# Altium footprint library Capacitors.PcbLib: 90 footprints (part 5 of 6)
Each footprint in its own frame and in the unit in brackets; x right, y up, seen from the top. Pads: shape width x height; smd on the part's side, far side on the other; paste and mask are expansions set on the pad; w line width, h text height; cw(c..) or ccw(c..) is an arc to the next point about the centre after c.
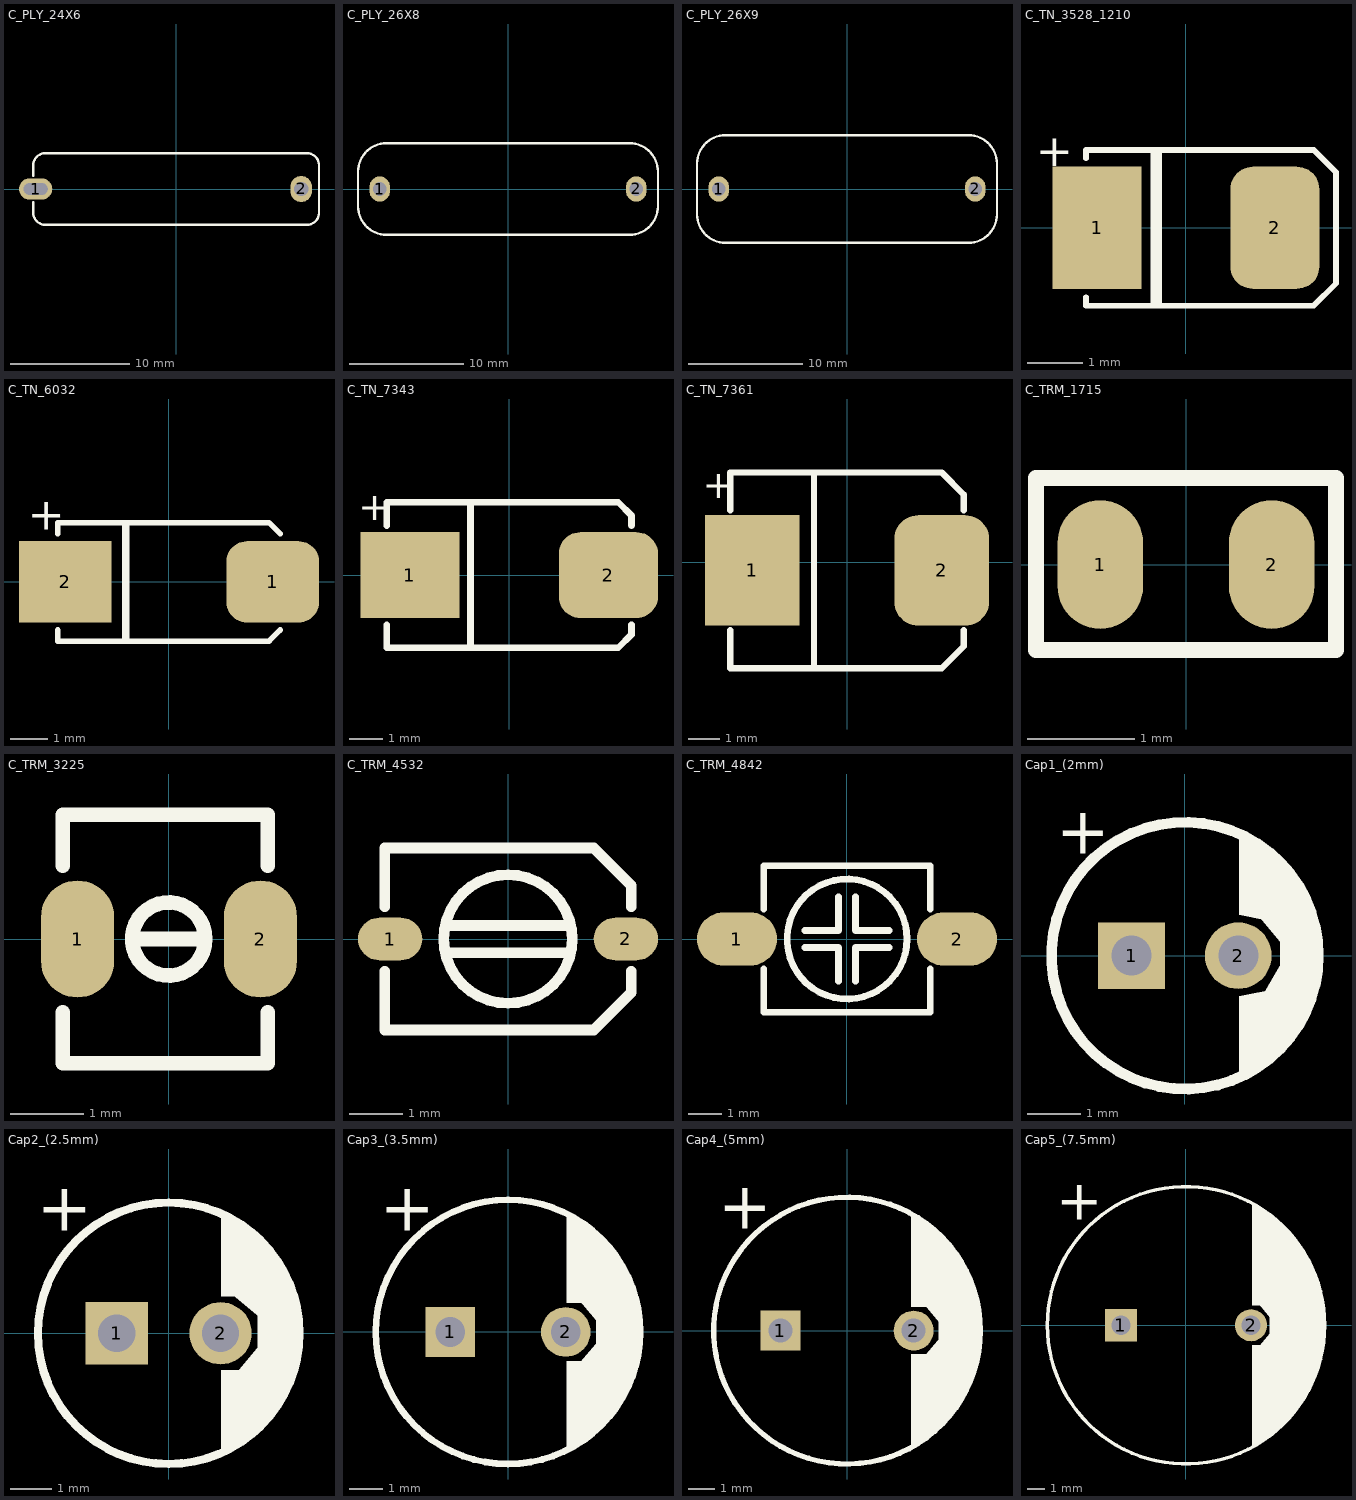
[diagram p4: the footprints below, top view; thin cyan lines are the x and y axes]

## C_PLY_24X6 [mm] "CAP, POLYESTER, 23.8X5.8mm pitch: 20.0mm, 0.33uF 400V"
pads (2):
  oval 2.8x1.8 hole 1 slot 2 at 0 deg: 1(-11.8,0)
  oval 1.8x2.2 hole 1.2: 2(10.5,0)
Top Overlay:
  lines w0.2: -12,-2.1 -12,-1.1 ; -12,-2 ccw(c-11,-2) -11,-3 11,-3 ccw(c11,-2) 12,-2 12,2.1 ; -12,1.1 -12,2.1 ; -12,2 cw(c-11,2) -11,3 11,3 cw(c11,2) 12,2
3D body "Cap 330n - 400V Poly_2009.STEP": height 10.92, standoff -3, extent -11.888,-2.85 11.862,2.901

## C_PLY_26X8 [mm] "CAP, POLYESTER, 26.0X7.8mm pitch: 20.0mm, 0.68uF 400V"
pads (2):
  oval 1.8x2.2 hole 1.2: 1(-11.2,0) 2(11.2,0)
Top Overlay:
  lines w0.2: -13.1,-1.5 ccw(c-10.6,-1.5) -10.6,-4 10.6,-4 ccw(c10.6,-1.5) 13.1,-1.5 13.1,1.5 ccw(c10.6,1.5) 10.6,4 -10.6,4 ccw(c-10.6,1.5) -13.1,1.5 -13.1,-1.5
3D body "User Library-ECQE(F) 0_33uf 630Vdc 250Vac.step": height 19, standoff -3, extent -13,-3.9 13,3.9

## C_PLY_26X9 [mm] "CAP, POLYESTER, 26.0X9.3mm pitch: 20.0mm, 0.68uF 400V"
pads (2):
  oval 1.8x2.2 hole 1.2: 1(-11.2,0) 2(11.2,0)
Top Overlay:
  lines w0.2: -13.1,-2.2 ccw(c-10.6,-2.2) -10.6,-4.7 10.6,-4.7 ccw(c10.6,-2.2) 13.1,-2.2 13.1,2.2 ccw(c10.6,2.2) 10.6,4.7 -10.6,4.7 ccw(c-10.6,2.2) -13.1,2.2 -13.1,-2.2
3D body "SW3dPS-ECQE(F) 0.47uf 630Vdc 250Vac.STEP": height 3, standoff -20.5, extent -13,-4.65 13,4.65

## C_TN_3528_1210 [mm] "CAPACITOR, TAN B, TAN H, TAN T, TAN M, 3528P, 1210P, 3.5X2.8mm"
pads (2):
  rect 1.6x2.2 smd mask+0.1: 1(-1.6,0)
  rrect50% 1.6x2.2 smd mask+0.1: 2(1.6,0)
Top Overlay:
  rectangle: -0.635,-1.397 -0.435,1.397
  lines w0.1: -1.8,-1.251 -1.8,-1.4 2.156,-1.4 2.3,-1.4 2.7,-1 2.7,1 2.3,1.4 -1.8,1.4 -1.8,1.251
  text "+" at -2.032,1.797 h1
3D body "User Library-AVX_BCASE.step": height 2.03, standoff 0, extent -1.596,-0.957 2.104,1.973

## C_TN_6032 [mm] "CAPACITOR, TAN C, TAN F, TAN U, TAN L, 6032P, 6.0X3.2mm"
height 2.8
pads (2):
  rrect50% 2.5x2.2 smd: 1(2.8,0)
  rect 2.5x2.2 smd: 2(-2.8,0)
Top Overlay:
  rectangle: -1.27,-1.651 -1.07,1.549
  lines w0.15: -3,-1.3 -3,-1.6 1.1,-1.6 2.7,-1.6 3,-1.3 ; -3,1.3 -3,1.6 -1.113,1.6 ; 3,1.3 2.7,1.6 -1.1,1.6 ; -1.1,1.6 -1.1,1.6
  text "+" at -3.81,1.115 h1.5
3D body "User Library-CAP_TANT_6032-28_y.step": height 2.8, standoff 0, extent -3.277,-1.75 3.023,1.75

## C_TN_7343 [mm] "CAPACITOR, TAN D, TAN E, TAN Y, TAN X, 7343P, 7.3X4.3m"
height 4.3
pads (2):
  rect 3x2.6 smd: 1(-3,0)
  rrect50% 3x2.6 smd: 2(3,0)
Top Overlay:
  region: -1.07,2.159 -1.27,2.159 -1.27,-2.159 -1.07,-2.159
  lines w0.2: -3.7,-1.5 -3.7,-2.2 3.3,-2.2 3.7,-1.8 3.7,-1.5 ; -3.7,1.5 -3.7,2.2 3.3,2.2 3.7,1.8 3.7,1.5
  text "+" at -4.572,1.369 h1.5
3D body "User Library-AVX_E_CASE.step": height 4.2, standoff 0, extent -3.7,-2.225 3.7,2.225

## C_TN_7361 [mm] "CAPACITOR, TAN V, 2924, 7361, 7.3X6.1mm"
pads (2):
  rect 3x3.5 smd: 1(-3,-0.254)
  rrect50% 3x3.5 smd: 2(3,-0.254)
Top Overlay:
  rectangle: -1.143,-3.302 -0.943,2.794
  lines w0.2: -3.7,-2.154 -3.7,-3.354 3,-3.354 3.7,-2.654 3.7,-2.154 ; -3.7,1.646 -3.7,2.846 3,2.846 3.7,2.146 3.7,1.646
  text "+" at -4.572,1.75 h1.5
3D body "User Library-CT_V.step": height 3.45, standoff 0, extent -3.65,-3.05 3.65,3.05

## C_TRM_1715 [mm] "Cap, Trimmer TZR1 1.7mmX1.5mm"
pads (2):
  oval 0.8x1.2 smd mask+0.075: 1(-0.8,0) 2(0.8,0)
Top Overlay:
  lines w0.15: -1.4,-0.796 1.4,-0.796 1.4,0.807 -1.4,0.807 -1.4,-0.796
3D body "User Library-TZR1.STEP": height 1, standoff -0.01, extent -0.864,-0.75 0.85,0.75

## C_TRM_3225 [mm] "Cap, Trimmer TZY2 3.2mmX2.5mm"
pads (2):
  oval 1x1.6 smd: 1(-1.25,0) 2(1.25,0)
Top Overlay:
  circle w0.2: c-0.004,0 r0.5
  lines w0.2: -1.45,-1 -1.45,-1.7 1.35,-1.7 1.35,-1 ; -1.45,1 -1.45,1.7 1.35,1.7 1.35,1 ; -0.431,0 0.496,0
3D body "User Library-tzy2seriestrimcap.step": height 1.24, standoff -0.01, extent -1.3,-1.6 1.2,1.6

## C_TRM_4532 [mm] "Cap, Trimmer TZC3 4.5X3.2mm"
pads (2):
  oval 1.2x0.8 smd: 1(-2.2,0) 2(2.2,0)
Top Overlay:
  circle w0.2: c0,0 r1.2
  lines w0.2: -2.3,-0.6 -2.3,-1.7 1.6,-1.7 2.3,-1 2.3,-0.6 ; -2.3,0.6 -2.3,1.7 1.6,1.7 2.3,1 2.3,0.6 ; -1.143,-0.254 1.143,-0.254 ; -1.143,0.254 1.143,0.254
3D body "User Library-TZC3P300A110R00.STEP": height 1.6, standoff 0, extent -2.25,-1.6 2.25,1.6

## C_TRM_4842 [mm] "Cap, Trimmer SMD 4.8x4.2mm"
pads (2):
  oval 2.4x1.6 smd: 1(-3.3,0) 2(3.3,0)
Top Overlay:
  circle w0.2: c0,0 r1.8
  lines w0.2: -2.5,-0.9 -2.5,-2.2 2.5,-2.2 2.5,-0.9 ; -2.5,0.9 -2.5,2.2 2.5,2.2 2.5,0.9 ; -1.27,-0.254 -0.254,-0.254 -0.254,-1.27 ; -1.27,0.254 -0.254,0.254 -0.254,1.27 ; 0.254,-1.27 0.254,-0.254 1.27,-0.254 ; 0.254,1.27 0.254,0.254 1.27,0.254
3D body "User Library-trimmer.step": height 3.25, standoff 0, extent -3.523,-2.1 3.523,2.1

## Cap1_(2mm) [mm] "Capacitor, Electrolytic, Radial; Body 5 x 6.8 mm (Dia.xH typ); Pin Spacing 2 mm"
height 7.8
pads (2):
  rect 1.25x1.25 hole 0.75: 1(-1,0)
  round 1.25 hole 0.75: 2(1,0)
Top Overlay:
  circle w0.2: c0,0 r2.5
  rectangle: 2.286,-0.254 2.54,0.254
  region: 1.592,0.883 1.397,0.72 1.969,0.039 2.163,0.202
  rectangle: 1.784,-0.825 2.419,0.826
  region: 2.032,-0.254 1.812,-0.127 1.368,-0.897 1.588,-1.024
  region: 1.016,0.762 1.016,2.286 1.524,1.905 2.159,1.27 2.449,0.544 2.392,0.487
  region: 1.016,-0.762 1.016,-2.286 1.524,-1.905 2.159,-1.27 2.449,-0.544 2.392,-0.487
  text "+" at -2.413,1.623 h1.5
3D body "User Library-Cap-EL(5x11-2)T.STEP": height 11, standoff -2.8, extent -2.5,-2.493 2.502,2.493

## Cap2_(2.5mm) [mm] "Capacitor, Electrolytic, Radial; Body 6.3 x 6.8 mm (Dia.xH typ); Pin Spacing 2.5 mm"
height 7.8
pads (2):
  rect 1.5x1.5 hole 0.9: 1(-1.25,0)
  round 1.5 hole 0.9: 2(1.25,0)
Top Overlay:
  circle w0.2: c0,0 r3.15
  rectangle: 2.556,-0.944 3.049,0.895
  rectangle: 2.937,-0.444 3.191,0.318
  rectangle: 2.57,0.836 2.995,1.029
  rectangle: 2.138,-1.281 2.773,1.132
  region: 2.6,0.858 1.942,1.41 1.539,0.93 2.197,0.378
  region: 2.108,-1.35 2.66,-0.692 2.18,-0.289 1.628,-0.947
  region: 1.27,-0.889 1.27,-2.921 2.032,-2.413 2.413,-2.032 2.667,-1.524 3.048,-0.889
  region: 1.27,0.889 1.27,2.921 2.032,2.413 2.413,2.032 2.667,1.524 3.048,0.889
  text "+" at -3.175,2.079 h2
3D body "User Library-Cap-EL(6_3x12-2_5).STEP": height 12, standoff -3.2, extent -3.15,-3.148 3.152,3.148

## Cap3_(3.5mm) [mm] "Capacitor, Electrolytic, Radial; Body 8 x 5 mm (Dia.xH typ); Pin Spacing 3.5 mm"
height 6
pads (2):
  rect 1.5x1.51 hole 0.9: 1(-1.75,0)
  round 1.5 hole 0.9: 2(1.75,0)
Top Overlay:
  circle w0.2: c0,0 r4
  rectangle: 2.667,-1.27 3.683,1.778
  rectangle: 3.556,-1.143 3.937,1.016
  region: 2.913,0.054 3.302,0.381 2.241,1.646 1.852,1.319
  region: 1.852,-1.319 2.241,-1.646 3.302,-0.381 2.913,-0.054
  region: 1.778,0.889 1.778,3.556 2.667,2.921 3.302,2.159 3.937,0.889
  region: 1.778,-0.889 1.778,-3.556 2.667,-2.921 3.302,-2.159 3.937,-0.889
  text "+" at -3.879,2.587 h2.5
3D body "User Library-Cap-EL(8x11_5-3_5).STEP": height 11.5, standoff -3.3, extent -4,-3.997 4.002,3.997

## Cap4_(5mm) [mm] "Capacitor, Electrolytic, Radial; Body 10 x 5 mm (Dia.xH typ); Pin Spacing 5 mm"
height 6
pads (2):
  rect 1.5x1.5 hole 0.9: 1(-2.5,0)
  round 1.5 hole 0.9: 2(2.5,0)
Top Overlay:
  circle w0.2: c0,0 r5
  region: 2.756,-1.136 3.145,-1.462 4.206,-0.198 3.817,0.129
  region: 3.663,0.054 4.052,0.381 2.991,1.646 2.602,1.319
  rectangle: 3.429,-1.016 4.953,1.016
  region: 2.413,0.889 2.413,4.318 3.302,3.683 3.937,3.048 4.318,2.413 4.953,0.889
  region: 2.413,-0.889 2.413,-4.318 3.302,-3.683 3.937,-3.048 4.318,-2.413 4.953,-0.889
  text "+" at -4.826,3.246 h3
3D body "User Library-Cap-EL(10x12-5)T.STEP": height 12.5, standoff -3.5, extent -5,-4.996 5.002,4.996

## Cap5_(7.5mm) [mm] "Capacitor, Electrolytic, Radial; Body 16 x 25 mm (Dia.xH typ); Pin Spacing 7.5 mm"
height 26
pads (2):
  rect 1.85x1.85 hole 1.1: 1(-3.75,0)
  round 1.85 hole 1.1: 2(3.75,0)
Top Overlay:
  circle w0.2: c0,0 r8
  region: 3.945,-1.52 4.334,-1.846 5.395,-0.582 5.006,-0.255
  region: 5.006,0.255 5.395,0.582 4.334,1.846 3.945,1.52
  rectangle: 4.826,-1.397 7.493,1.524
  rectangle: 7.403,-1.199 7.969,1.214
  region: 3.81,-1.143 3.81,-6.985 4.699,-6.477 5.588,-5.715 6.35,-4.953 7.366,-3.175 7.747,-1.778 8.001,-1.143
  region: 3.81,1.143 3.81,6.985 4.699,6.477 5.588,5.715 6.35,4.953 7.366,3.175 7.747,1.778 8.001,1.143
  text "+" at -7.493,5.301 h4
3D body "User Library-Cap-EL(16x31_5-7_5)T.STEP": height 41, standoff -3, extent -8,-8 8.002,8